# Altium footprint library BASIC.PcbLib: 244 footprints (part 14 of 16)
Each footprint in its own frame and in the unit in brackets; x right, y up, seen from the top. Pads: shape width x height; smd on the part's side, far side on the other; paste and mask are expansions set on the pad; w line width, h text height; cw(c..) or ccw(c..) is an arc to the next point about the centre after c.
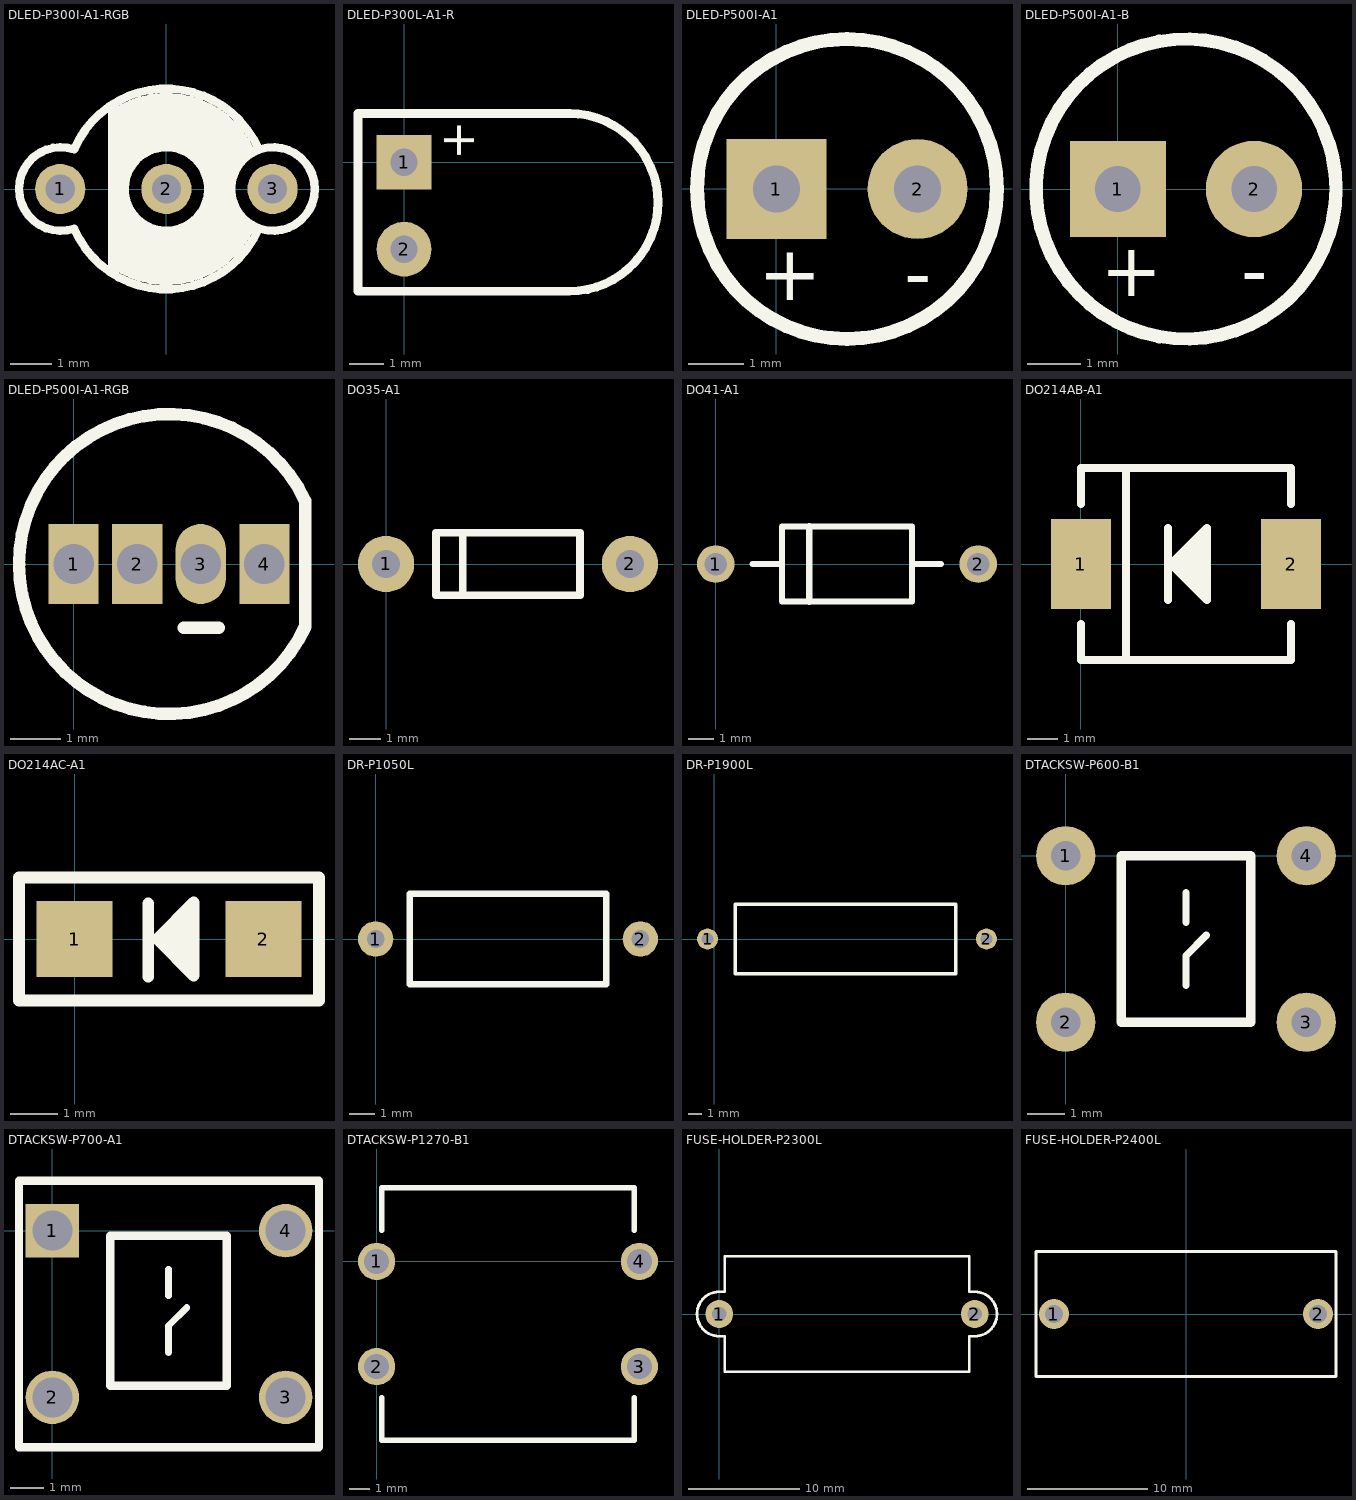
[diagram p13: the footprints below, top view; thin cyan lines are the x and y axes]

## DLED-P300I-A1-RGB [mm]
height 5
pads (3):
  round 1.2 hole 0.7: 1(-2.54,0) 2(0,0) 3(2.54,0)
Top Overlay:
  circle w0.2: c2.55,0 r1
  lines w0.2: -2.204,-0.947 cw(c-2.525,0) -2.202,0.946 ; -2.202,0.954 cw(c0,0) 2.193,0.975 ; -2.201,-0.958 ccw(c0,0) 2.194,-0.972 ; -1.279,-1.666 ccw(c0,0) 1.925,-0.839 ; -1.279,-1.405 ccw(c0,0) 1.783,-0.657 ; -1.279,1.405 cw(c0,0) 1.783,0.657 ; -1.279,1.666 cw(c0,0) 1.925,0.839 ; -1.271,-1.796 ccw(c0,0) 2.017,-0.879 ; -1.271,1.796 cw(c0,0) 2.017,0.879 ; -1.269,0.592 cw(c0,0) -1.228,-0.672 ; -1.264,-1.137 ccw(c0,0) 1.636,-0.463 ; -1.264,1.137 cw(c0,0) 1.636,0.463 ; -1.257,-1.288 ccw(c0,0) 1.689,-0.622 ; -1.257,1.288 cw(c0,0) 1.689,0.622 ; -1.218,-1.587 ccw(c0,0) 1.833,-0.799 ; -1.218,1.587 cw(c0,0) 1.833,0.799 ; -1.115,-1.003 ccw(c0,0) 1.456,-0.359 ; -0.919,0.394 ccw(c0,0) -0.906,0.423 ; 1.694,0.69 ccw(c2.55,0) 2.091,-1
  lines w0.254: -1.275,-1.975 -1.275,2
  lines w0.3: -1.19,-1.07 ccw(c0,0) 1.553,-0.383 ; -1.19,1.07 cw(c0,0) 1.553,0.383 ; -1.185,0.191 ccw(c0,0) -1.14,0.374
3D body "User Library-3mmBiColorLED.STEP": height 7.46, standoff -2.58, extent -2.794,-2.048 2.794,2

## DLED-P300L-A1-R [mm]
pads (2):
  rect 1.6x1.6 hole 0.8: 1(-0.006,0.003)
  round 1.6 hole 0.8: 2(-0.006,-2.537)
Top Overlay:
  lines w0.254: 4.816,-3.771 ccw(c4.816,-1.171) 4.816,1.429 ; 4.824,-3.772 -1.352,-3.772 -1.352,1.428 4.855,1.428
  text "+" at 1.174,1.214 h1
3D body "User Library-LED_d3-RED.STEP": height 3.24, standoff -0.05, extent -0.218,-2.838 7.257,0.375

## DLED-P500I-A1 [mm]
pads (2):
  rect 1.8x1.8 hole 0.85: 1(0,0)
  round 1.8 hole 0.85: 2(2.54,0)
Top Overlay:
  circle w0.25: c1.27,0 r2.7
  text "+" at -0.325,-2 h1
  text "-" at 2.3,-2 h1

## DLED-P500I-A1-B [mm]
pads (2):
  rect 1.8x1.8 hole 0.85: 1(0,0)
  round 1.8 hole 0.85: 2(2.54,0)
Top Overlay:
  circle w0.25: c1.27,0 r2.8
  text "+" at -0.325,-2 h1
  text "-" at 2.3,-2 h1
3D body "LEDd5B.STEP": height 9.51, standoff -5.29, extent -1.82,-2.95 3.6,3.07

## DLED-P500I-A1-RGB [mm]
height 9
pads (4):
  rect 1x1.6 hole 0.8: 1(0,0) 2(1.27,0) 4(3.81,0)
  oval 1x1.6 hole 0.8: 3(2.54,0)
Top Overlay:
  lines w0.25: 4.625,1.265 ccw(c1.905,0) 4.63,-1.255 ; 4.629,-1.245 4.629,1.26
  lines w0.254: 2.205,-1.275 2.9,-1.275
3D body "零?": height 8.9, standoff -4, extent -0.99,-2.875 4.41,2.925

## DO35-A1 [mm]
pads (2):
  round 1.8 hole 0.9: 1(0,0) 2(7.8,0)
Top Overlay:
  lines w0.25: 2.45,-1 2.45,1 ; 1.6,-1 6.2,-1 6.2,1 1.6,1 1.6,-1
3D body "DO-35.STEP": height 1.85, standoff -2.56, extent -0.24,-0.91 7.94,1.01

## DO41-A1 [mm]
pads (2):
  round 1.5 hole 0.9: 1(0,0) 2(10.5,0)
Top Overlay:
  lines w0.254: 1.478,0 2.627,0 ; 3.747,-1.506 3.747,1.506 ; 7.856,0 9.005,0 ; 2.65,-1.5 7.85,-1.5 7.85,1.5 2.65,1.5 2.65,-1.5
3D body "User Library-DO-41-4.STEP": height 2.86, standoff -2.35, extent -0.372,-1.373 10.988,1.347

## DO214AB-A1 [mm]
height 3
pads (2):
  rect 2x3 smd: 1(0,0) 2(7,0)
Top Overlay:
  lines w0.254: 0,-2 0,-3.2 7,-3.2 7,-2 ; 0,2 0,3.2 7,3.2 7,2 ; 1.5,-3.2 1.5,3.2 ; 2.9,-1.2 2.9,1.2 ; 3.2,0 4.1,-0.9 ; 3.3,0.1 3.9,0.7 ; 3.5,-0.1 3.5,0.2 ; 3.7,-0.4 3.7,0.4 ; 3.8,-0.6 3.8,0.6 ; 4,-0.6 4,0.9 ; 3,0 4.2,1.2 4.2,-1.2 3,0
3D body "User Library-DIOM8261X24.STEP": height 2.4, standoff 0.03, extent -0.515,-3.02 7.615,3.08

## DO214AC-A1 [mm]
height 2.2
pads (2):
  rect 1.6x1.6 smd: 1(0,0) 2(4,0)
Top Overlay:
  lines w0.25: 1.56,-0.8 1.56,0.75 ; 2,-0.1 2,0.15 ; 2.2,-0.325 2.2,0.35 ; 2.375,-0.5 2.375,0.525 ; -1.175,-1.3 5.175,-1.3 5.175,1.3 -1.175,1.3 -1.175,-1.3 ; 1.75,0 2.525,-0.775 2.525,0.775 1.75,0
3D body "SW3dPS-DO-214AC SMA.STEP": height 2.4, standoff 0, extent -0.6,-1.375 4.6,1.225

## DR-P1050L [mm]
pads (2):
  round 1.4 hole 0.7: 1(0,0) 2(10.5,0)
Top Overlay:
  lines w0.25: 1.35,-1.8 9.15,-1.8 9.15,1.8 1.35,1.8 1.35,-1.8

## DR-P1900L [mil]
pads (2):
  round 60 hole 33.46: 1(-19.68,0) 2(776.02,0)
Top Overlay:
  lines w10: 59.06,-98.43 688.98,-98.43 688.98,98.43 59.06,98.43 59.06,-98.43
3D body "User Library-RES 2W -H  L=15 D=5 d=0,8 Pin2Pin=20,32.STEP": height 216.54, standoff -178.87, extent -37.07,-99.86 794.43,97

## DTACKSW-P600-B1 [mm]
pads (4):
  round 1.6 hole 0.8: 1(0,0) 2(0,-4.5) 3(6.5,-4.5) 4(6.5,0)
Top Overlay:
  lines w0.2: 3.25,-3.5 3.25,-2.7 3.8,-2.15 ; 3.25,-1.8 3.25,-1
  lines w0.25: 1.5,-4.5 1.5,0 5,0 5,-4.5 1.5,-4.5
3D body "User Library-TPxxxx (Switch).STEP": height 4.9, standoff -3.59, extent -0.783,-5.133 7.185,0.867

## DTACKSW-P700-A1 [mm]
pads (4):
  rect 1.6x1.6 hole 1.2: 1(-0.001,-0.002)
  round 1.6 hole 1.2: 2(-0.001,-5.002) 3(6.999,-5.002) 4(6.999,-0.002)
Top Overlay:
  lines w0.2: 3.485,-3.655 3.485,-2.855 4.035,-2.305 ; 3.485,-1.955 3.485,-1.155
  lines w0.25: 1.735,-4.655 1.735,-0.155 5.235,-0.155 5.235,-4.655 1.735,-4.655
  lines w0.254: -1.001,-6.502 7.999,-6.502 7.999,1.498 -1.001,1.498 -1.001,-6.492
3D body "User Library-TS-1170-WP.STEP": height 7, standoff -3.5, extent -0.685,-5.642 7.583,0.858

## DTACKSW-P1270-B1 [mm]
pads (4):
  round 1.8 hole 1.2: 1(0,-0.001) 2(0,-5.081) 3(12.7,-5.081) 4(12.7,-0.001)
Top Overlay:
  lines w0.25: 0.25,-6.58 0.25,-8.641 12.45,-8.641 12.45,-6.58 ; 0.25,1.499 0.25,3.559 12.45,3.559 12.45,1.499
3D body "User Library-tact switch 12x12x8mm.STEP": height 8.5, standoff -3.5, extent -0.598,-8.542 13.272,3.458

## FUSE-HOLDER-P2300L [mm]
height 16
pads (2):
  round 2.5 hole 1.3: 1(0,0) 2(23,0)
Top Overlay:
  lines w0.254: 0,-2 cw(c0,0) 0,2 0.5,2 0.5,5.2 22.5,5.2 22.5,2 23,2 cw(c23,0) 23,-2 22.5,-2 22.5,-5.2 0.5,-5.2 0.5,-2 0,-2
3D body "User Library-Fuse_Holder.STEP": height 13.44, standoff -5.4, extent -0.12,-4.5 23.04,4.5

## FUSE-HOLDER-P2400L [mm]
pads (2):
  round 2.5 hole 1.5: 1(-11,0) 2(11,0)
Top Overlay:
  lines w0.254: -12.5,-5.2 -12.5,5.2 12.5,5.2 12.5,-5.2 -12.5,-5.2